# Altium footprint library UserLibrary.PcbLib: 41 footprints (part 3 of 3)
Each footprint in its own frame and in the unit in brackets; x right, y up, seen from the top. Pads: shape width x height; smd on the part's side, far side on the other; paste and mask are expansions set on the pad; w line width, h text height; cw(c..) or ccw(c..) is an arc to the next point about the centre after c.
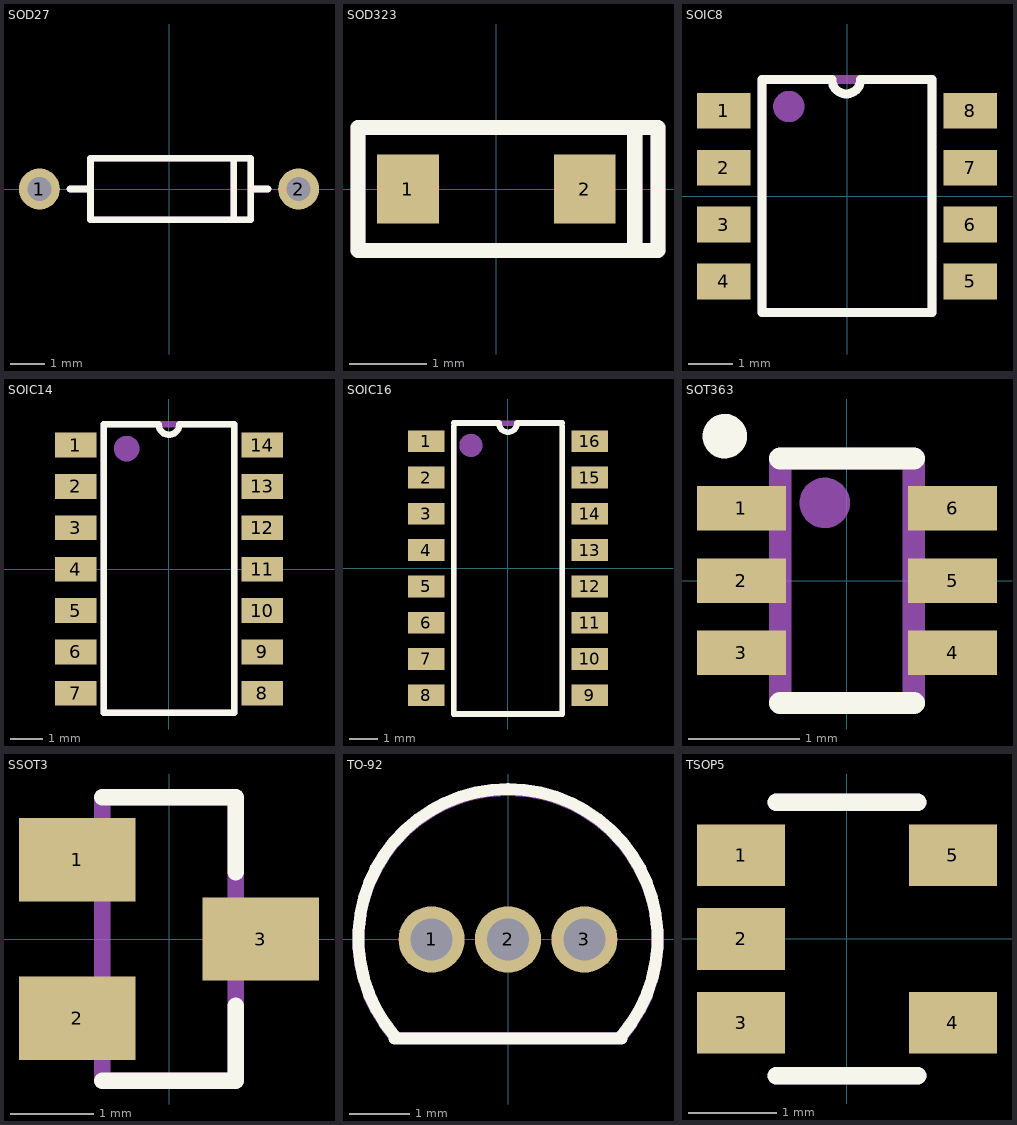
[diagram p2: the footprints below, top view; thin cyan lines are the x and y axes]

## SOD27 [mm]
pads (2):
  round 1.2 hole 0.7: 1(-3.8,0) 2(3.8,0)
Top Overlay:
  lines w0.2: -2.9,0 -2.3,0 ; 1.9,-0.9 1.9,0.9 ; 2.5,0 2.9,0 ; -2.3,-0.9 -2.3,0.9 2.4,0.9 2.4,-0.9 -2.3,-0.9
Mechanical 29:
  lines w0.2: -2.9,0 -2.3,0 ; 1.9,-0.9 1.9,0.9 ; 2.4,0 2.9,0 ; -2.3,-0.9 2.4,-0.9 2.4,0.9 -2.3,0.9 -2.3,-0.9
  text ".Designator" at -1.5,-0.9 h1.2
3D body: height 1.95, standoff 0.05, extent -1.8,-0.946 1.8,0.946
3D body "DO-35G-30.step": height 1.82, standoff -2, extent -4.085,-0.901 4.085,0.901

## SOD323 [mm]
pads (2):
  rect 0.8x0.9 smd: 1(-1.15,0) 2(1.15,0)
Top Overlay:
  lines w0.2: 1.8,-0.8 2.1,-0.8 2.1,0.8 1.8,0.8 ; 1.8,-0.8 -1.8,-0.8 -1.8,0.8 1.8,0.8 ; 1.8,-0.8 1.8,0.8
Mechanical 29:
  lines w0.2: 1.8,-0.8 1.8,0.8 ; -1.8,-0.8 2.1,-0.8 2.1,0.8 -1.8,0.8 -1.8,-0.8
  text ".Designator" at -0.7,-0.2 h0.6
3D body "SOD323.STEP": height 0.94, standoff 0.01, extent -1.244,-0.65 1.244,0.6

## SOIC8 [mm]
pads (8):
  rect 1.2x0.8 smd: 1(-2.75,1.905) 2(-2.75,0.635) 3(-2.75,-0.635) 4(-2.75,-1.905) 5(2.75,-1.905) 6(2.75,-0.635) 7(2.75,0.635) 8(2.75,1.905)
Top Overlay:
  lines w0.2: -1.9,-2.6 1.9,-2.6 1.9,2.6 0.301,2.6 cw(c-0.016,2.6) -0.334,2.6 -1.9,2.6 -1.9,-2.6
Mechanical 29:
  circle w0.5: c-1.3,2 r0.1
  lines w0.2: -1.9,-2.6 -1.9,2.6 1.9,2.6 1.9,-2.6 -1.9,-2.6
  text ".Designator" at 0.5,-1.2 h1.2
3D body "SOIC8.STEP": height 1.75, standoff 0, extent -3,-2.45 3,2.45

## SOIC14 [mm]
pads (14):
  rect 1.27x0.76 smd: 1(-2.86,3.81) 2(-2.86,2.54) 3(-2.86,1.27) 4(-2.86,0) 5(-2.86,-1.27) 6(-2.86,-2.54) 7(-2.86,-3.81) 8(2.86,-3.81) 9(2.86,-2.54) 10(2.86,-1.27) 11(2.86,0) 12(2.86,1.27) 13(2.86,2.54) 14(2.86,3.81)
Top Overlay:
  lines w0.2: -2,-4.4 -2,4.445 -0.318,4.445 ccw(c0,4.445) 0.318,4.445 2,4.445 2,-4.4 -2,-4.4
Mechanical 29:
  circle w0.5: c-1.3,3.7 r0.141
  lines w0.2: -2,-4.4 -2,4.445 2,4.445 2,-4.4 -2,-4.4
  text ".Designator" at 0.438,-2.246 h1.52
3D body "SOIC14.STEP": height 1.75, standoff 0, extent -2.9,-4.275 2.9,4.275

## SOIC16 [mm]
pads (16):
  rect 1.27x0.76 smd: 1(-2.86,4.445) 2(-2.86,3.175) 3(-2.86,1.905) 4(-2.86,0.635) 5(-2.86,-0.635) 6(-2.86,-1.905) 7(-2.86,-3.175) 8(-2.86,-4.445) 9(2.86,-4.445) 10(2.86,-3.175) 11(2.86,-1.905) 12(2.86,-0.635) 13(2.86,0.635) 14(2.86,1.905) 15(2.86,3.175) 16(2.86,4.445)
Top Overlay:
  lines w0.2: -1.9,4.98 -1.9,-5.1 1.9,-5.1 1.9,4.98 ; -1.9,5.08 -0.318,5.08 ccw(c0,5.08) 0.318,5.08 1.9,5.08
Mechanical 29:
  circle w0.5: c-1.3,4.3 r0.152
  lines w0.2: -1.9,4.975 -1.9,-5.1 1.9,-5.1 1.9,4.975 ; -1.9,5.075 1.9,5.075
  text ".Designator" at 0.6,-1.7 h0.9
3D body "SOIC16.step": height 1.4, standoff 0, extent -3,-4.95 3,4.95

## SOT363 [mm]
pads (6):
  rect 0.8x0.4 smd: 1(-0.95,0.65) 2(-0.95,0) 3(-0.95,-0.65) 4(0.95,-0.65) 5(0.95,0) 6(0.95,0.65)
Top Overlay:
  circle w0.2: c-1.1,1.3 r0.1
  lines w0.2: -0.6,-1.1 0.6,-1.1 ; -0.6,1.1 0.6,1.1
Mechanical 29:
  circle w0.254: c-0.2,0.7 r0.1
  lines w0.2: -0.6,-1.1 0.6,-1.1 0.6,1.1 -0.6,1.1 -0.6,-1.1
  text ".Designator" at 0.2,-0.6 h0.6
3D body "SOT363.STEP": height 1, standoff 0, extent -1.15,-1.05 1.15,1.05

## SSOT3 [mm]
pads (3):
  rect 1.4x1 smd: 1(-1.1,0.95) 2(-1.1,-0.95) 3(1.1,0)
Top Overlay:
  lines w0.2: -0.8,-1.7 0.8,-1.7 0.8,-0.8 ; -0.8,1.7 0.8,1.7 0.8,0.8
Mechanical 29:
  lines w0.2: -0.8,-1.7 0.8,-1.7 0.8,1.7 -0.8,1.7 -0.8,-1.7
  text ".Designator" at 0.2,-1 h0.6
3D body "SSOT3.STEP": height 0.98, standoff -0.15, extent -1.542,-1.5 1.543,1.5

## TO-92 [mm]
pads (3):
  round 1.1 hole 0.7: 1(-1.27,0) 2(0,0) 3(1.27,0)
Top Overlay:
  lines w0.2: -1.89,-1.65 1.89,-1.65 ; -1.89,-1.6 cw(c0,0.015) 1.89,-1.6
Mechanical 29:
  lines w0.2: -1.89,-1.64 1.89,-1.64 ; -1.89,-1.615 cw(c0,0) 1.89,-1.615
  text ".Designator" at -1.225,-0.875 h1.2
3D body "TO-92A.STEP": height 5.4, standoff -5.6, extent -2.4,-1.53 2.4,2.4

## TSOP5 [mm]
pads (5):
  rect 1x0.7 smd: 1(-1.2,0.95) 2(-1.2,0) 3(-1.2,-0.95) 4(1.2,-0.95) 5(1.2,0.95)
Top Overlay:
  lines w0.2: -0.8,-1.55 0.8,-1.55 ; -0.8,1.55 0.8,1.55
Mechanical 29:
  lines w0.2: -0.8,-1.55 0.8,-1.55 ; -0.8,1.55 0.8,1.55
  text ".Designator" at 0.9,-0.9 h0.9
3D body "SOT753.step": height 1.01, standoff -0.04, extent -1.406,-1.475 1.4,1.475